# Altium footprint library 3.11-电路模块.PcbLib: 25 footprints (part 2 of 2)
Each footprint in its own frame and in the unit in brackets; x right, y up, seen from the top. Pads: shape width x height; smd on the part's side, far side on the other; paste and mask are expansions set on the pad; w line width, h text height; cw(c..) or ccw(c..) is an arc to the next point about the centre after c.
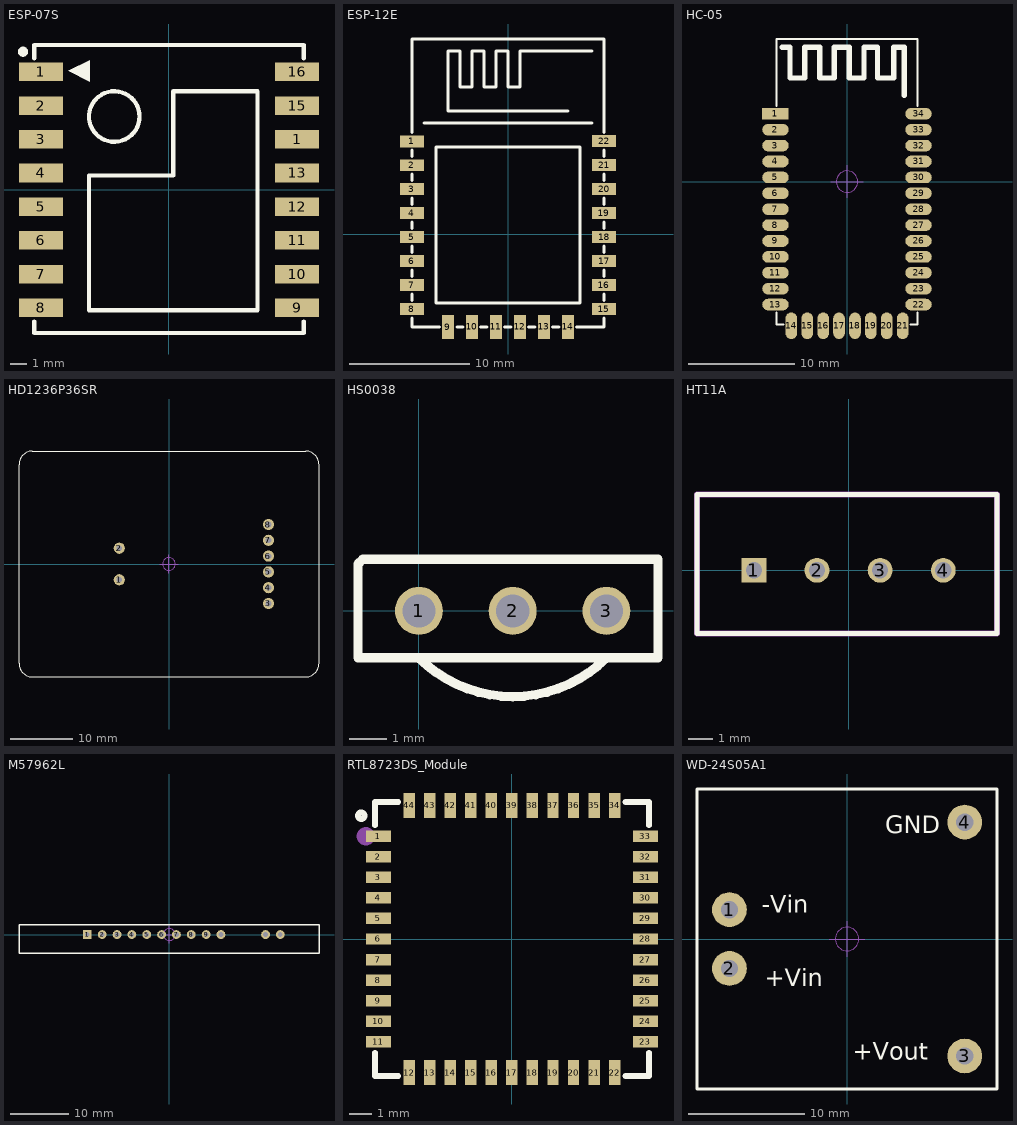
[diagram p1: the footprints below, top view; thin cyan lines are the x and y axes]

## ESP-07S [mm]
pads (16):
  rect 2.6x1.1 smd: 1(-7.6,7) 1(7.6,3) 2(-7.6,5) 3(-7.6,3) 4(-7.6,1) 5(-7.6,-1) 6(-7.6,-3) 7(-7.6,-5) 8(-7.6,-7) 9(7.6,-7) 10(7.6,-5) 11(7.6,-3) 12(7.6,-1) 13(7.6,1) 15(7.6,5) 16(7.6,7)
Top Overlay:
  circle w0.3: c-8.659,8.196 r0.15
  circle w0.254: c-3.249,4.35 r1.5
  region: -5.969,7.053 -4.699,6.418 -4.699,7.688
  lines w0.254: -8.001,-7.806 -8,-7.807 -8,-8.5 8,-8.5 8,-7.807 ; -8.001,7.815 -8,7.816 -8,8.6 8,8.6 8,7.816 ; -4.749,-7.15 5.251,-7.15 5.251,5.85 1.251,5.85 0.251,5.85 0.251,0.85 -4.749,0.85 -4.749,-7.15
3D body: height 3.28, standoff 0, extent -8,-8.5 8,8.5

## ESP-12E [mm] "ESP-12 Wi-Fi Module by AI-Thinker"
pads (22):
  rect 2x1 smd: 1(-8.002,7.74) 2(-8.002,5.74) 3(-8.002,3.74) 4(-8.002,1.74) 5(-8.002,-0.26) 6(-8.002,-2.26) 7(-8.002,-4.26) 8(-8.001,-6.26) 15(7.999,-6.26) 16(8,-4.26) 17(8.002,-2.26) 18(8.001,-0.26) 19(8,1.74) 20(8.001,3.74) 21(8.001,5.74) 22(8.001,7.74)
  rect 1x2 smd: 9(-5.001,-7.74) 10(-3.001,-7.739) 11(-1.001,-7.739) 12(0.999,-7.739) 13(2.999,-7.739) 14(4.999,-7.74)
Top Overlay:
  lines w0.254: -8.002,-6.991 -8.002,-7.739 -5.731,-7.739 ; -8.002,-5.529 -8.002,-4.991 ; -8.002,-3.529 -8.002,-2.991 ; -8.002,-1.529 -8.002,-0.991 ; -8.002,0.471 -8.002,1.009 ; -8.002,2.471 -8.002,3.009 ; -8.002,4.471 -8.002,5.009 ; -8.002,6.471 -8.002,7.009 ; -8.002,8.471 -8.002,16.261 7.998,16.261 7.998,8.471 ; -7.002,9.261 6.998,9.261 ; -4.269,-7.739 -3.733,-7.739 ; -2.271,-7.739 -1.734,-7.739 ; -0.272,-7.739 0.266,-7.739 ; 1.729,-7.739 2.266,-7.739 ; 3.728,-7.739 4.266,-7.739 ; 4.998,10.261 -5.002,10.261 -5.002,15.261 -4.002,15.261 -4.002,12.261 -3.002,12.261 -3.002,15.261 -2.002,15.261 -2.002,12.261 -1.002,12.261 -1.002,15.261 -0.002,15.261 -0.002,12.261 0.998,12.261 0.998,15.261 6.998,15.261 ; 5.728,-7.739 7.998,-7.739 ; 7.998,-7.653 7.998,-6.991 ; 7.998,-5.529 7.998,-4.991 ; 7.998,-3.529 7.998,-2.991 ; 7.998,-1.529 7.998,-0.991 ; 7.998,0.471 7.998,1.009 ; 7.998,2.471 7.998,3.009 ; 7.998,4.471 7.998,5.009 ; 7.998,6.471 7.998,7.009 ; -6.002,-5.739 -6.002,7.261 5.998,7.261 5.998,-5.739 -6.002,-5.739
3D body: height 2.65, standoff -0.04, extent -8.005,-7.714 8.005,16.291

## HC-05 [mm] "串口蓝牙模块"
pads (34):
  rect 2.5x1.1 smd: 1(-6.75,6.403)
  oval 2.5x1.1 smd: 2(-6.75,4.903) 3(-6.75,3.403) 4(-6.75,1.903) 5(-6.75,0.403) 6(-6.75,-1.097) 7(-6.75,-2.597) 8(-6.75,-4.097) 9(-6.75,-5.597) 10(-6.75,-7.097) 11(-6.75,-8.597) 12(-6.75,-10.097) 13(-6.75,-11.597) 22(6.75,-11.597) 23(6.75,-10.097) 24(6.75,-8.597) 25(6.75,-7.097) 26(6.75,-5.597) 27(6.75,-4.097) 28(6.75,-2.597) 29(6.75,-1.097) 30(6.75,0.403) 31(6.75,1.903) 32(6.75,3.403) 33(6.75,4.903) 34(6.75,6.403)
  oval 1.1x2.5 smd: 14(-5.25,-13.597) 15(-3.75,-13.597) 16(-2.25,-13.597) 17(-0.75,-13.597) 18(0.75,-13.597) 19(2.25,-13.597) 20(3.75,-13.597) 21(5.25,-13.597)
Top Overlay:
  lines w0.203: -6.647,-12.37 -6.647,-13.487 -6.012,-13.487 ; -6.647,7.163 -6.647,13.462 6.637,13.462 6.637,7.163 ; 6.002,-13.487 6.637,-13.487 6.637,-12.37
  lines w0.508: -6.139,12.7 -5.377,12.7 -5.377,9.779 -3.98,9.779 -3.98,12.7 -2.583,12.7 -2.583,9.779 -1.186,9.779 -1.186,12.7 0.211,12.7 0.211,9.779 1.608,9.779 1.608,12.7 2.878,12.7 2.878,9.779 4.402,9.779 4.402,12.7 5.418,12.7 5.418,8.128
Mechanical 15:
  circle w0.1: c0,0.003 r1.016
  lines w0.1: -1.524,0.003 1.524,0.003 ; 0,-1.521 0,1.527
3D body: height 2.46, standoff 0.03, extent -6.52,-13.367 6.52,13.353

## HD1236P36SR [mm] "长：48mm，宽：36mm，高：23mm"
pads (8):
  round 1.8 hole 0.9: 1(-8.001,-2.54) 2(-8.001,2.54) 3(15.999,-6.35) 4(15.999,-3.81) 5(15.999,-1.27) 6(15.999,1.27) 7(15.999,3.81) 8(15.999,6.35)
Top Overlay:
  lines w0.2: -24.13,-16.002 -24.13,15.993 cw(c-21.962,15.993) -21.962,18.161 21.971,18.161 ; -24.13,-15.993 ccw(c-21.962,-15.993) -21.962,-18.161 ; -21.971,-18.161 21.971,-18.161 ; 21.962,-18.161 ccw(c21.962,-15.993) 24.13,-15.993 ; 21.962,18.161 cw(c21.962,15.993) 24.13,15.993 ; 24.13,-16.002 24.13,16.002
Mechanical 15:
  circle w0.1: c-0.001,0 r1.016
  lines w0.1: -1.525,0 1.523,0 ; -0.001,-1.524 -0.001,1.524
3D body: height 23.05, standoff -3.45, extent -24.001,-18 23.999,18

## HS0038 [mm] "联系卖家 免费查找封装"
pads (3):
  round 1.3 hole 0.9: 1(0,0) 2(2.54,0) 3(5.08,0)
Top Overlay:
  lines w0.254: 0,-1.27 ccw(c2.54,1.27) 5.08,-1.27 ; -1.651,-1.27 -1.651,1.27 -1.524,1.397 6.477,1.397 6.477,-1.27 -1.651,-1.27

## HT11A [mm] "联系卖家 免费查找封装"
pads (4):
  rect 1x1 hole 0.65: 1(-3.81,0)
  round 1 hole 0.65: 2(-1.27,0) 3(1.27,0) 4(3.81,0)
Top Overlay:
  lines w0.2: -6.096,-2.54 -6.096,3.048 5.969,3.048 5.969,-2.54 -6.096,-2.54
Mechanical 14:
  lines w0.254: -6.096,-2.54 -6.096,3.048 5.969,3.048 5.969,-2.54 -6.096,-2.54
3D body: height 15.7, standoff -3.3, extent -6,-2.496 6,3.004

## M57962L [mm] "IGBT驱动模块     淘宝ID:黄晶宝石"
pads (12):
  rect 1.5x1.5 hole 0.8: 1(-14.021,0)
  round 1.5 hole 0.8: 2(-11.481,0) 3(-8.941,0) 4(-6.401,0) 5(-3.861,0) 6(-1.321,0) 7(1.219,0) 8(3.759,0) 9(6.299,0) 10(8.839,0) 13(16.459,0) 14(18.999,0)
Top Overlay:
  lines w0.254: -25.705,-3.175 -25.705,1.651 24.079,1.651 25.603,1.651 25.603,-3.175 -25.705,-3.175
Mechanical 15:
  circle w0.1: c0,0 r1.016
  lines w0.1: -1.524,0 1.524,0 ; 0,-1.524 0,1.524
3D body: height 25, standoff -4.64, extent -25.5,-3 25.5,1.5

## RTL8723DS_Module [mm]
pads (44):
  rect 1.1x0.5 smd: 1(-5.85,4.5) 2(-5.85,3.6) 3(-5.85,2.7) 4(-5.85,1.8) 5(-5.85,0.9) 6(-5.85,0) 7(-5.85,-0.9) 8(-5.85,-1.8) 9(-5.85,-2.7) 10(-5.85,-3.6) 11(-5.85,-4.5) 23(5.85,-4.5) 24(5.85,-3.6) 25(5.85,-2.7) 26(5.85,-1.8) 27(5.85,-0.9) 28(5.85,0) 29(5.85,0.9) 30(5.85,1.8) 31(5.85,2.7) 32(5.85,3.6) 33(5.85,4.5)
  rect 0.5x1.1 smd: 12(-4.5,-5.85) 13(-3.6,-5.85) 14(-2.7,-5.85) 15(-1.8,-5.85) 16(-0.9,-5.85) 17(0,-5.85) 18(0.9,-5.85) 19(1.8,-5.85) 20(2.7,-5.85) 21(3.6,-5.85) 22(4.5,-5.85) 34(4.5,5.85) 35(3.6,5.85) 36(2.7,5.85) 37(1.8,5.85) 38(0.9,5.85) 39(0,5.85) 40(-0.9,5.85) 41(-1.8,5.85) 42(-2.7,5.85) 43(-3.6,5.85) 44(-4.5,5.85)
Top Overlay:
  circle w0.254: c-6.6,5.4 r0.141
  lines w0.254: -6,-4.981 -6,-6 -4.981,-6 ; -6,4.981 -6,6 -4.981,6 ; 4.981,-6 6,-6 6,-4.981 ; 4.981,6 6,6 6,4.981
Mechanical 15:
  circle w0.4: c-6.4,4.5 r0.2

## WD-24S05A1 [mm] "3W-24V转5V模块     淘宝ID:黄晶宝石"
pads (4):
  round 3 hole 1.5: 1(-10.15,2.538) 2(-10.15,-2.542) 3(10.17,-10.102) 4(10.17,10.098)
Top Overlay:
  lines w0.254: -12.954,-12.954 -12.954,12.954 12.954,12.954 12.954,-12.954 -12.954,-12.954
  text "+Vin" at -7.112,-4.064 h1.52
  text "-Vin" at -7.366,2.286 h1.52
  text "GND" at 3.302,9.144 h1.52
  text "+Vout" at 0.508,-10.414 h1.52
Mechanical 15:
  circle w0.1: c0,0 r1.016
  lines w0.1: -1.524,0 1.524,0 ; 0,-1.524 0,1.524
3D body: height 8.6, standoff -3.1, extent -12.75,-12.75 12.75,12.75